# Altium footprint library AltiumLibrary.PcbLib: 90 footprints (part 2 of 6)
Each footprint in its own frame and in the unit in brackets; x right, y up, seen from the top. Pads: shape width x height; smd on the part's side, far side on the other; paste and mask are expansions set on the pad; w line width, h text height; cw(c..) or ccw(c..) is an arc to the next point about the centre after c.
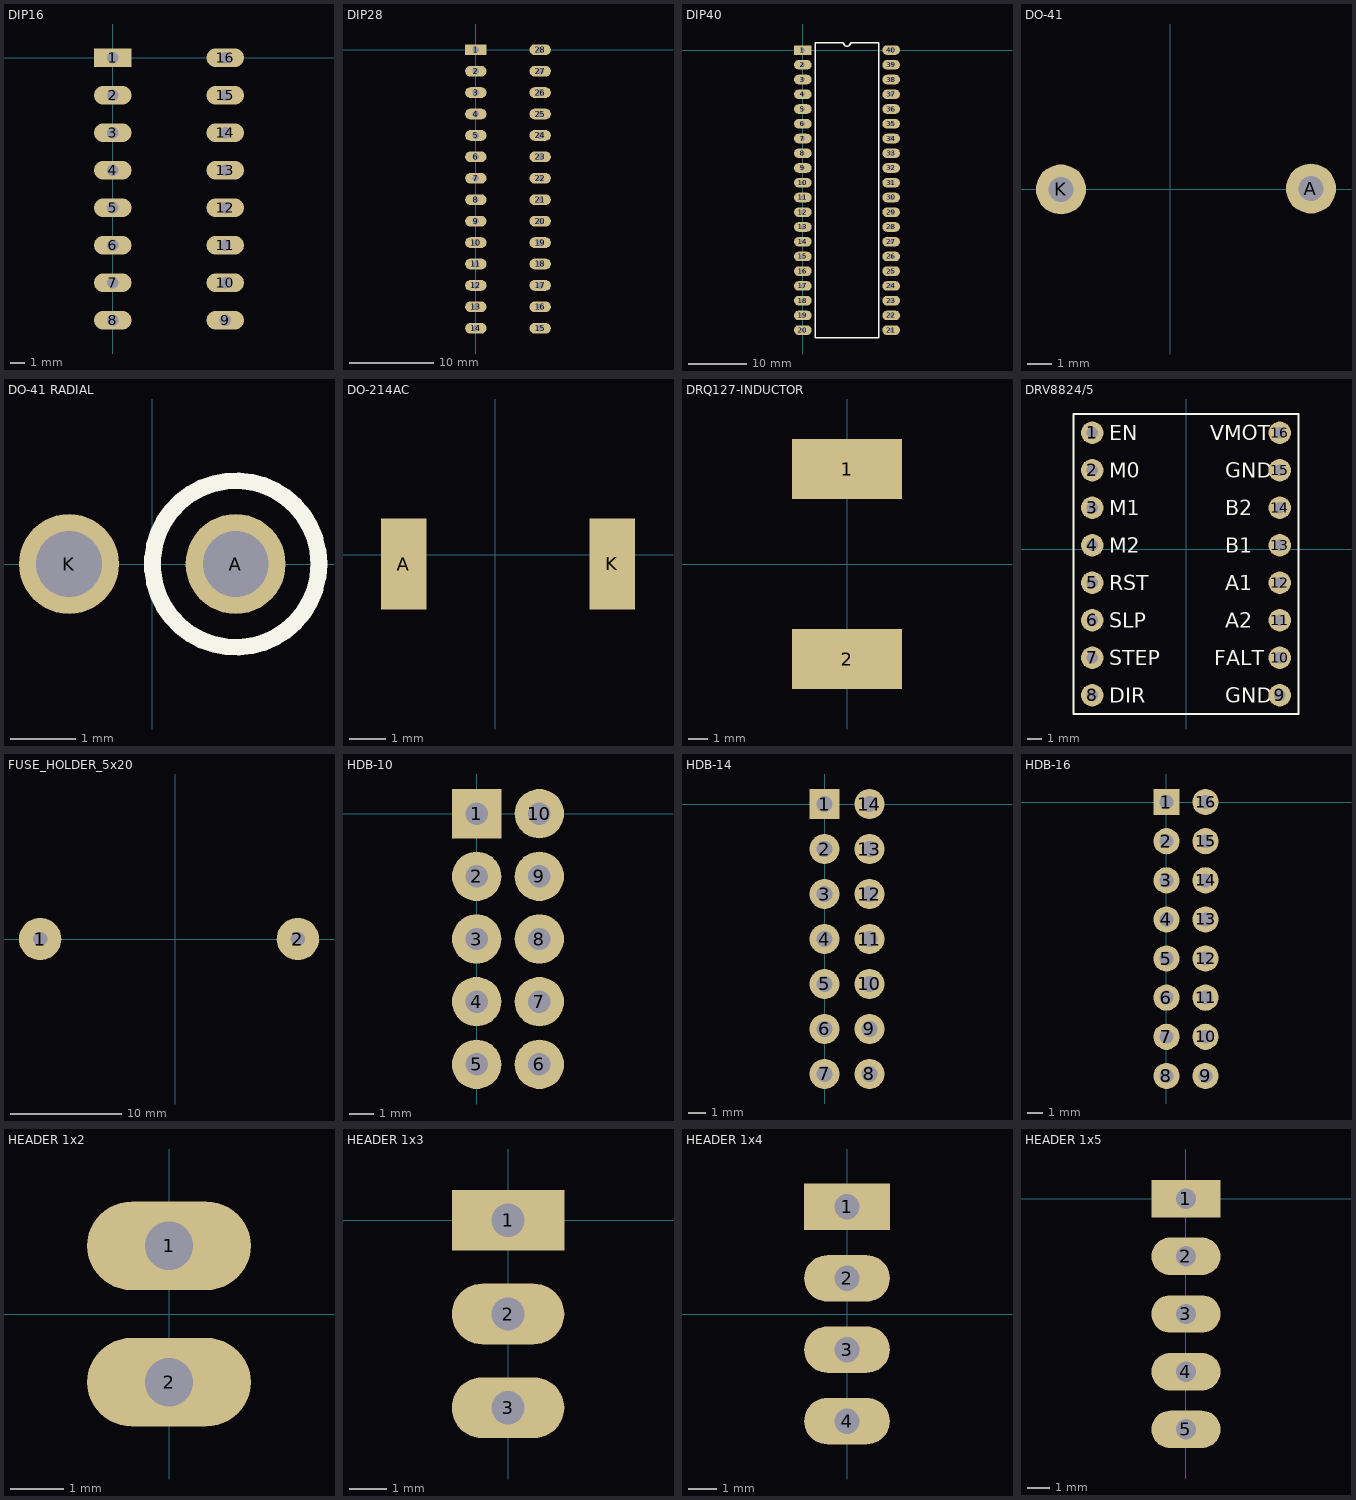
[diagram p1: the footprints below, top view; thin cyan lines are the x and y axes]

## DIP16 [mm]
pads (16):
  rect 2.54x1.27 hole 0.8: 1(0,0)
  oval 2.54x1.27 hole 0.8: 2(0,-2.54) 3(0,-5.08) 4(0,-7.62) 5(0,-10.16) 6(0,-12.7) 7(0,-15.24) 8(0,-17.78) 9(7.62,-17.78) 10(7.62,-15.24) 11(7.62,-12.7) 12(7.62,-10.16) 13(7.62,-7.62) 14(7.62,-5.08) 15(7.62,-2.54) 16(7.62,0)
3D body "CircuitWorks-DIP 16 IC.step": height 5.1, standoff -3.3, extent -0.125,-18.89 7.745,1.11

## DIP28 [mm]
pads (28):
  rect 2.54x1.27 hole 0.8: 1(0,0)
  oval 2.54x1.27 hole 0.8: 2(0,-2.54) 3(0,-5.08) 4(0,-7.62) 5(0,-10.16) 6(0,-12.7) 7(0,-15.24) 8(0,-17.78) 9(0,-20.32) 10(0,-22.86) 11(0,-25.4) 12(0,-27.94) 13(0,-30.48) 14(0,-33.02) 15(7.62,-33.02) 16(7.62,-30.48) 17(7.62,-27.94) 18(7.62,-25.4) 19(7.62,-22.86) 20(7.62,-20.32) 21(7.62,-17.78) 22(7.62,-15.24) 23(7.62,-12.7) 24(7.62,-10.16) 25(7.62,-7.62) 26(7.62,-5.08) 27(7.62,-2.54) 28(7.62,0)
3D body "User Library-User Library-ATmega 48_88_168_328 28P3_90DEG.step": height 5.09, standoff -2.04, extent -0.254,-33.761 7.652,0.889

## DIP40 [mil]
pads (40):
  rect 120x65 hole 31.5: 1(0,0)
  oval 120x65 hole 31.5: 2(0,-100) 3(0,-200) 4(0,-300) 5(0,-400) 6(0,-500) 7(0,-600) 8(0,-700) 9(0,-800) 10(0,-900) 11(0,-1000) 12(0,-1100) 13(0,-1200) 14(0,-1300) 15(0,-1400) 16(0,-1500) 17(0,-1600) 18(0,-1700) 19(0,-1800) 20(0,-1900) 21(600,-1900) 22(600,-1800) 23(600,-1700) 24(600,-1600) 25(600,-1500) 26(600,-1400) 27(600,-1300) 28(600,-1200) 29(600,-1100) 30(600,-1000) 31(600,-900) 32(600,-800) 33(600,-700) 34(600,-600) 35(600,-500) 36(600,-400) 37(600,-300) 38(600,-200) 39(600,-100) 40(600,0)
Top Overlay:
  lines w10: 85,-1950 85,50 275,50 ccw(c300,50) 325,50 515,50 515,-1950 85,-1950
3D body "User Library-DIP40-600-with-chip-Type2.step": height 317.08, standoff -122.29, extent -48.46,-1979 644.46,78.48

## DO-41 [mil]
pads (2):
  round 80 hole 39.37: A(224.99,1.45) K(-175,0)
3D body "User Library-DO-41-2.step": height 107.09, standoff -102.36, extent -192.01,-52.08 242.01,55

## DO-41 RADIAL [mil]
pads (2):
  round 60 hole 39.37: A(50,0) K(-50,0)
Top Overlay:
  circle w10: c50,0 r50
3D body: height 0, standoff 0, extent -100,-50 100,50

## DO-214AC [mil]
pads (2):
  rect 50x100 smd: A(-100,-10) K(128.01,-9.99)
3D body "User Library-DO-214AC(SMA).step": height 95, standoff 5, extent -87.99,-64.99 128.01,45

## DRQ127-INDUCTOR [mil]
pads (2):
  rect 220x120 smd: 1(0,190) 2(0,-190)
3D body "User Library-DRQ127_12_5x12_5.step": height 310.28, standoff -4.68, extent -246.06,-246.06 246.06,246.07

## DRV8824/5 [mil]
pads (16):
  round 60 hole 30: 1(-250,310) 2(-250,210) 3(-250,110) 4(-250,10) 5(-250,-90) 6(-250,-190) 7(-250,-290) 8(-250,-390) 9(250,-390) 10(250,-290) 11(250,-190) 12(250,-90) 13(250,10) 14(250,110) 15(250,210) 16(250,310)
Top Overlay:
  lines w5: -300,-440 300,-440 300,360 -300,360 -300,-440
  text "M0" at -205,190 h40
  text "M1" at -205,90 h40
  text "M2" at -205,-10 h40
  text "STEP" at -205,-310 h40
  text "DIR" at -205,-410 h40
  text "GND" at 105,-410 h40
  text "FALT" at 75,-310 h40
  text "A2" at 105,-210 h40
  text "A1" at 105,-110 h40
  text "B1" at 105,-10 h40
  text "B2" at 105,90 h40
  text "GND" at 105,190 h40
  text "VMOT" at 65,290 h40
  text "EN" at -205,290 h40
  text "RST" at -205,-110 h40
  text "SLP" at -205,-210 h40
3D body "DRV8825.step": height 242.5, standoff -190.69, extent -292.12,-440 292.12,360

## FUSE_HOLDER_5x20 [mil]
pads (2):
  round 150 hole 50: 1(-477.97,0.01) 2(433.84,0.01)
3D body "User Library-Fuse_Holder.STEP": height 521.77, standoff -220.2, extent -477.97,-177.16 433.84,177.17

## HDB-10 [mm]
pads (10):
  rect 2x2 hole 0.9: 1(0,0)
  round 2 hole 0.9: 2(0,-2.54) 3(0,-5.08) 4(0,-7.62) 5(0,-10.16) 6(2.54,-10.16) 7(2.54,-7.62) 8(2.54,-5.08) 9(2.54,-2.54) 10(2.54,0)
3D body "User Library-HDB-10.step": height 8.8, standoff -3, extent -3.712,-15.18 5.688,5.02

## HDB-14 [mm]
pads (14):
  rect 1.7x1.7 hole 0.9: 1(0,0)
  round 1.7 hole 0.9: 2(0,-2.54) 3(0,-5.08) 4(0,-7.62) 5(0,-10.16) 6(0,-12.7) 7(0,-15.24) 8(2.54,-15.24) 9(2.54,-12.7) 10(2.54,-10.16) 11(2.54,-7.62) 12(2.54,-5.08) 13(2.54,-2.54) 14(2.54,0)
3D body "User Library-HDB-14.step": height 2.49, standoff -9.31, extent -3.712,-20.26 5.688,5.02

## HDB-16 [mm]
pads (16):
  rect 1.7x1.7 hole 0.9: 1(0,0)
  round 1.7 hole 0.9: 2(0,-2.54) 3(0,-5.08) 4(0,-7.62) 5(0,-10.16) 6(0,-12.7) 7(0,-15.24) 8(0,-17.78) 9(2.54,-17.78) 10(2.54,-15.24) 11(2.54,-12.7) 12(2.54,-10.16) 13(2.54,-7.62) 14(2.54,-5.08) 15(2.54,-2.54) 16(2.54,0)
3D body "User Library-HDB-16.step": height 2.49, standoff -9.31, extent -3.43,-22.86 5.97,4.96

## HEADER 1x2 [mil]
pads (2):
  oval 120x65 hole 35.43: 1(0,50) 2(0,-50)
3D body "User Library-Header_Male_2Pin.STEP": height 336.22, standoff -118.11, extent -49.01,-99.99 49.01,100.01

## HEADER 1x3 [mil]
pads (3):
  rect 120x65 hole 35.43: 1(0,0)
  oval 120x65 hole 35.43: 2(0,-100) 3(0,-200)
3D body "User Library-Header_Male_3Pin.STEP": height 336.22, standoff -118.11, extent -49.01,-249.99 49.01,50.01

## HEADER 1x4 [mil]
pads (4):
  rect 120x65 hole 35.43: 1(0,150)
  oval 120x65 hole 35.43: 2(0,50) 3(0,-50) 4(0,-150)
3D body "User Library-Header_Male_4Pin.STEP": height 336.22, standoff -118.11, extent -49.01,-200 49.02,200

## HEADER 1x5 [mil]
pads (5):
  rect 120x65 hole 35.43: 1(0,0)
  oval 120x65 hole 35.43: 2(0,-100) 3(0,-200) 4(0,-300) 5(0,-400)
3D body "User Library-Header_Male_5Pin.STEP": height 336.22, standoff -118.11, extent -49.01,-450 49.02,50